# Altium footprint library Power.PcbLib: 11 footprints
Each footprint in its own frame and in the unit in brackets; x right, y up, seen from the top. Pads: shape width x height; smd on the part's side, far side on the other; paste and mask are expansions set on the pad; w line width, h text height; cw(c..) or ccw(c..) is an arc to the next point about the centre after c.
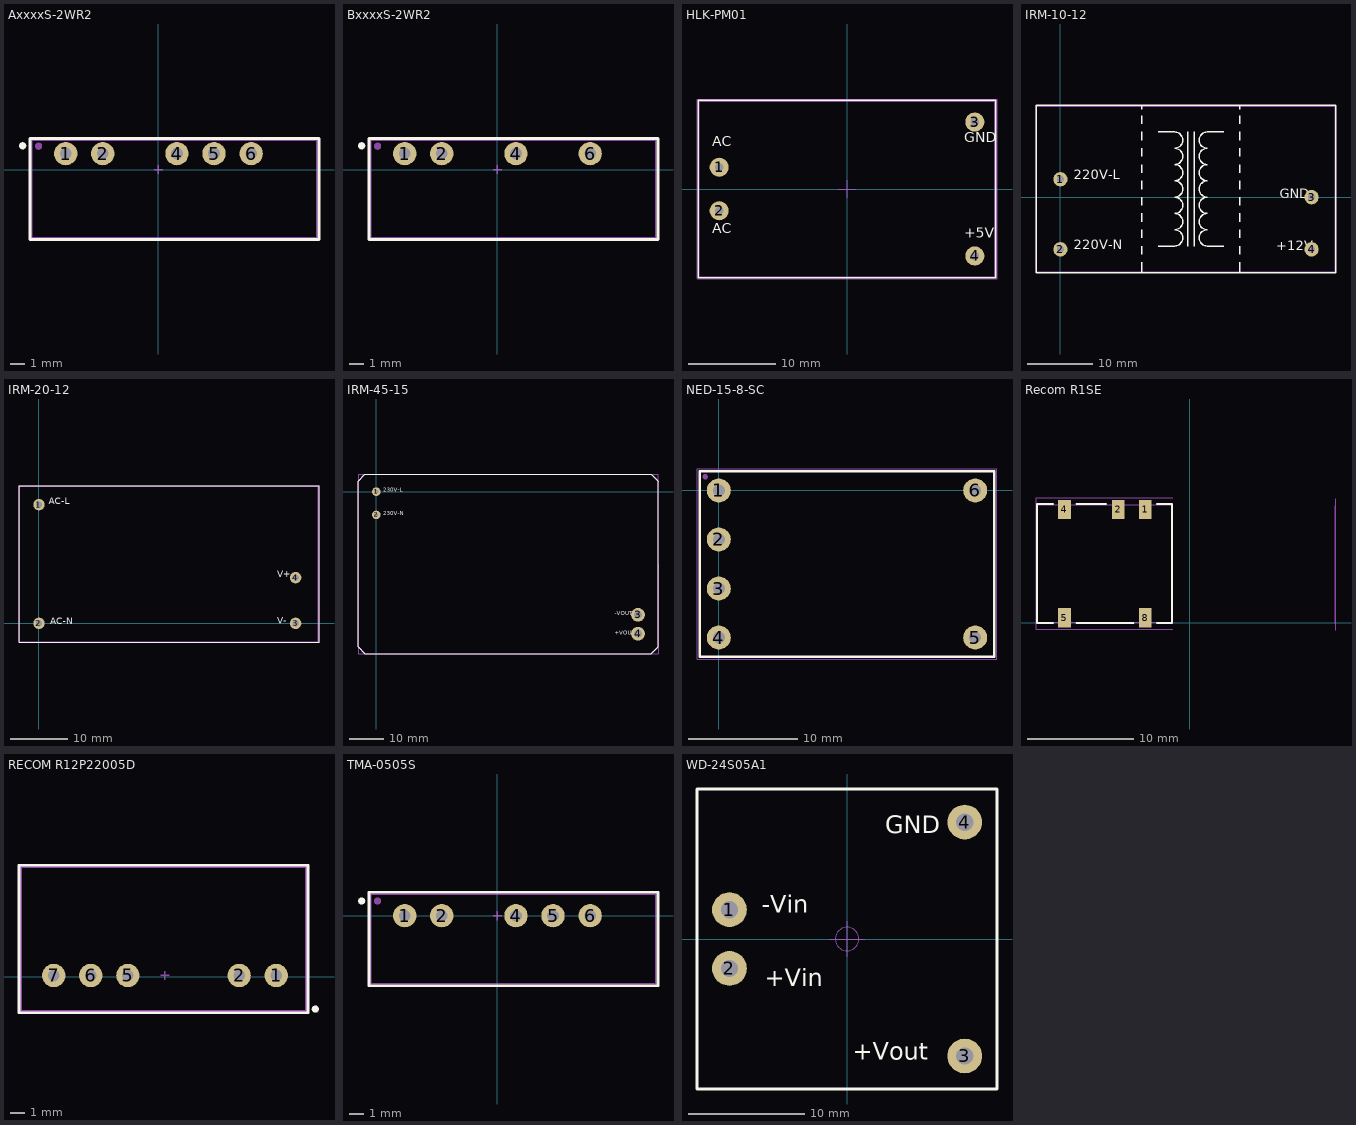
[diagram p0: the footprints below, top view; thin cyan lines are the x and y axes]

## AxxxxS-2WR2 [mm]
pads (7):
  round 1.6 hole 0.8: 1(-6.35,1.092) 2(-3.81,1.092) 4(1.27,1.092) 5(3.81,1.092) 6(6.35,1.092)
  round 0.5 on Top Overlay: ""(-9.296,1.626)
  round 0.5 on Mech1: ""(-8.204,1.6)
Top Overlay:
  lines w0.2: -8.8,-4.8 11,-4.8 11,2.134 -8.8,2.134 -8.8,-4.8
Mechanical 1:
  lines w0.1: -8.66,-4.67 -8.66,2.007 10.84,2.007 10.84,-4.67 -8.66,-4.67
Mechanical 15:
  lines w0.1: -0.3,0 0.3,0 ; 0,-0.3 0,0.3 ; -8.8,-4.8 11,-4.8 11,2.134 -8.8,2.134 -8.8,-4.8
3D body "AxxxxS-2WR2 (1).STEP": height 10.23, standoff -3.53, extent -8.562,-4.89 11.088,2.21

## BxxxxS-2WR2 [mm]
pads (6):
  round 1.6 hole 0.8: 1(-6.35,1.092) 2(-3.81,1.092) 4(1.27,1.092) 6(6.35,1.092)
  round 0.5 on Top Overlay: ""(-9.296,1.626)
  round 0.5 on Mech1: ""(-8.204,1.6)
Top Overlay:
  lines w0.2: -8.8,-4.8 -8.8,2.134 11,2.134 11,-4.8 -8.8,-4.8
Mechanical 1:
  lines w0.1: -8.66,-4.67 10.84,-4.67 10.84,2.007 -8.66,2.007 -8.66,-4.67
Mechanical 15:
  lines w0.1: -0.3,0 0.3,0 ; 0,-0.3 0,0.3 ; -8.8,-4.8 -8.8,2.134 11,2.134 11,-4.8 -8.8,-4.8
3D body "BxxxxS-2WR2 (1).STEP": height 10.23, standoff -3.53, extent -8.585,-5.043 11.065,2.057

## HLK-PM01 [mm]
height 15
pads (4):
  round 2.2 hole 1: 1(-14.7,2.5) 2(-14.7,-2.5) 3(14.7,7.7) 4(14.7,-7.7)
Top Overlay:
  lines w0.2: -17.1,-10.2 -17.1,10.2 17.1,10.2 17.1,-10.2 -0.2,-10.2 -17.1,-10.2
  text "GND" at 13.5,5 h2
  text "+5V" at 13.5,-6 h2
  text "AC" at -15.5,-5.5 h2
  text "AC" at -15.5,4.5 h2
Mechanical 1:
  lines w0.1: -17,-10.1 -17,10.1 17,10.1 17,-10.1 -17,-10.1
Mechanical 15:
  lines w0.1: -1,0 1,0 ; 0,-1 0,1 ; -17.25,-10.35 17.25,-10.35 17.25,10.35 -17.25,10.35 -17.25,-10.35
3D body "HLK-PM01.STEP": height 15.07, standoff -4.95, extent -17,-10.1 17,10.1

## IRM-10-12 [mm]
pads (4):
  round 2.2 hole 1.1: 1(0,2.75) 2(0,-8) 3(38.5,0) 4(38.5,-8)
Top Overlay:
  lines w0.2: 12.5,-11.5 12.5,-10 ; 12.5,-8.75 12.5,-7.5 ; 12.5,-6.25 12.5,-5 ; 12.5,-3.75 12.5,-2.5 ; 12.5,-1.25 12.5,0 ; 12.5,1.25 12.5,2.5 ; 12.5,3.75 12.5,5 ; 12.5,6.25 12.5,7.5 ; 12.5,8.75 12.5,10 ; 12.5,11.25 12.5,12.5 ; 12.5,13.5 12.5,14 ; 15,-7.5 17.5,-7.5 ccw(c17.5,-6.25) 17.5,-5 ccw(c17.5,-3.75) 17.5,-2.5 ccw(c17.5,-1.25) 17.5,0 ccw(c17.5,1.25) 17.5,2.5 ccw(c17.5,3.75) 17.5,5 ccw(c17.5,6.25) 17.5,7.5 ccw(c17.5,8.75) 17.5,10 15,10 ; 19.5,-7.5 19.5,10 ; 20.5,-7.5 20.5,10 ; 25,-7.5 22.5,-7.5 cw(c22.5,-6.25) 22.5,-5 cw(c22.5,-3.75) 22.5,-2.5 cw(c22.5,-1.25) 22.5,0 cw(c22.5,1.25) 22.5,2.5 cw(c22.5,3.75) 22.5,5 cw(c22.5,6.25) 22.5,7.5 cw(c22.5,8.75) 22.5,10 25,10 ; 27.5,-11.5 27.5,-10 ; 27.5,-8.75 27.5,-7.5 ; 27.5,-6.25 27.5,-5 ; 27.5,-3.75 27.5,-2.5 ; 27.5,-1.25 27.5,0 ; 27.5,1.25 27.5,2.5 ; 27.5,3.75 27.5,5 ; 27.5,6.25 27.5,7.5 ; 27.5,8.75 27.5,10 ; 27.5,11.25 27.5,12.5 ; 27.5,13.5 27.5,14 ; -3.75,-11.6 -3.75,14.1 42.25,14.1 42.25,-11.6 -3.75,-11.6
  text "GND" at 33.6,-0.7 h2.5
  text "+12V" at 33.1,-8.7 h2.5
  text "220V-L" at 2,2.2 h2.5
  text "220V-N" at 2,-8.5 h2.5
Mechanical 1:
  lines w0.1: -3.6,-11.45 42.099,-11.45 42.099,13.95 -3.6,13.95 -3.6,-11.45
Mechanical 15:
  lines w0.1: -3.7,-11.55 -3.7,14.05 42.2,14.05 42.2,-11.55 -3.7,-11.55
3D body "User Library-IRM-10-12.STEP": height 22.05, standoff -3.5, extent -3.6,-11.45 42.099,13.95

## IRM-20-12 [mm]
pads (4):
  round 2 hole 1.1: 1(0,20.8) 2(0,0) 3(45,0) 4(45,8)
Top Overlay:
  lines w0.2: -3.5,-3.3 49.1,-3.3 49.1,24.1 -3.5,24.1 -3.5,-3.3
  text "V+" at 41.8,7.6 h2
  text "V-" at 41.8,-0.5 h2
  text "AC-N" at 2,-0.6 h2
  text "AC-L" at 1.7,20.4 h2
Mechanical 1:
  lines w0.1: -3.4,-3.2 49,-3.2 49,24 -3.4,24 -3.4,-3.2
  text "V+" at 41.8,7.6 h2
  text "V-" at 41.8,-0.5 h2
  text "AC-N" at 2,-0.6 h2
  text "AC-L" at 1.7,20.4 h2
Mechanical 15:
  lines w0.1: -3.5,-3.3 -3.5,24.1 49.1,24.1 49.1,-3.3 -3.5,-3.3
3D body "IRM-20-12.STEP": height 24, standoff -3, extent -3.4,-3.2 49,24

## IRM-45-15 [mm]
pads (4):
  round 2.5 hole 1.2: 1(0,0) 2(0,-6.75)
  round 4 hole 2.2: 3(76,-35.75) 4(76,-41.25)
Top Overlay:
  lines w0.2: -5.3,3 -5.3,-45.05 -3.3,-47.05 79.8,-47.05 81.8,-45.05 81.8,3 79.8,5 -3.3,5 -5.3,3 ; -5.3,3 -5.3,3
  text "-VOUT" at 69.25,-36.25 h2
  text "+VOUT" at 69.25,-42 h2
  text "230V-L" at 2,-0.5 h2
  text "230V-N" at 2,-7.25 h2
Mechanical 1:
  lines w0.1: -5.3,-45.05 -3.25,-47.1 79.75,-47.1 81.8,-45.05 81.8,3 79.8,5 -3.3,5 -5.3,3 -5.3,-45.05
  text "-VOUT" at 69.25,-36.25 h2
  text "+VOUT" at 69.25,-42 h2
  text "230V-N" at 2,-7.25 h2
  text "230V-L" at 2,-0.5 h2
Mechanical 15:
  lines w0.1: -5.3,-47.1 -5.3,5.1 81.8,5.1 81.8,-47.1 -5.3,-47.1
3D body "IRM-45-15.step": height 29.51, standoff -3.5, extent -5.25,-47 81.75,5

## NED-15-8-SC [mm]
pads (7):
  round 2.2 hole 1.1: 1(0,0) 2(0,-4.5) 3(0,-9) 4(0,-13.5) 5(23.5,-13.5) 6(23.5,0)
  round 0.5 on Mech1: ""(-1.25,1.25)
Top Overlay:
  lines w0.2: -1.75,-15.25 -1.75,1.75 25.25,1.75 25.25,-15.25 -1.75,-15.25
Mechanical 1:
  lines w0.1: -1.75,-15.25 25.25,-15.25 25.25,1.75 -1.75,1.75 -1.75,-15.25
Mechanical 15:
  lines w0.1: -2,-15.5 -2,2 25.5,2 25.5,-15.5 -2,-15.5
3D body "PCB for isolatorPcbDoc.step": height 8.2, standoff -3.57, extent -1.75,-15.25 25.25,1.75

## Recom R1SE [mm]
pads (5):
  rect 1.2x1.8 smd: 1(-4.166,10.668) 2(-6.706,10.668) 4(-11.786,10.668) 5(-11.786,0.468) 8(-4.166,0.468)
Top Overlay:
  lines w0.2: -12.866,-0.032 -14.366,-0.032 -14.366,11.168 -12.866,11.168 ; -10.666,-0.032 -5.266,-0.032 ; -10.666,11.168 -7.866,11.168 ; -3.066,-0.032 -1.666,-0.032 -1.666,11.168 -3.066,11.168
Mechanical 1:
  lines w0.1: -1.641,0.018 -14.391,0.018 -14.391,11.118 -1.641,11.118 ; 13.726,-0.058 13.726,11.042
Mechanical 15:
  lines w0.1: -1.566,-0.632 -14.466,-0.632 -14.466,11.768 -1.566,11.768 ; 13.801,-0.708 13.801,11.692
3D body "User Library-RECOM_R1S-xxxx.STEP": height 7, standoff 0, extent -14.391,0.018 -1.641,11.118

## RECOM R12P22005D [mm]
pads (6):
  round 1.6 hole 0.8: 1(-4.547,0.076) 2(-7.087,0.076) 5(-14.707,0.076) 6(-17.247,0.076) 7(-19.787,0.076)
  round 0.5 on Top Overlay: ""(-1.867,-2.224)
Top Overlay:
  lines w0.2: -22.167,-2.474 -22.167,7.626 -2.367,7.626 -2.367,-2.474 -22.167,-2.474
Mechanical 1:
  lines w0.1: -22.017,-2.324 -22.017,7.476 -2.517,7.476 -2.517,-2.324 -22.017,-2.324
Mechanical 15:
  lines w0.1: -12.467,0.076 -11.867,0.076 ; -12.167,-0.224 -12.167,0.376 ; -22.117,-2.424 -22.117,7.576 -2.417,7.576 -2.417,-2.424 -22.117,-2.424
3D body "SIP-7 (19.5x9.8x12.5).STEP": height 12.51, standoff -4.09, extent -22.017,-2.324 -2.517,7.476

## TMA-0505S [mm]
pads (7):
  round 1.6 hole 0.8: 1(-6.35,0) 2(-3.81,0) 4(1.27,0) 5(3.81,0) 6(6.35,0)
  round 0.5 on Top Overlay: ""(-9.3,1)
  round 0.5 on Mech1: ""(-8.21,1)
Top Overlay:
  lines w0.2: -8.8,-4.8 -8.8,1.6 11,1.6 11,-4.8 -8.8,-4.8
Mechanical 1:
  lines w0.1: -8.66,-4.67 10.84,-4.67 10.84,1.45 -8.66,1.45 -8.66,-4.67
Mechanical 15:
  lines w0.1: -0.3,0 0.3,0 ; 0,-0.3 0,0.3 ; -8.8,-4.8 -8.8,1.6 11,1.6 11,-4.8 -8.8,-4.8
3D body "User Library-Traco TMA 0505S.STEP": height 10.2, standoff -3.2, extent -8.66,-4.67 10.84,1.45

## WD-24S05A1 [mm] "3W-24Vת5Vģ��"
pads (4):
  round 3 hole 1.5: 1(-10.15,2.538) 2(-10.15,-2.542) 3(10.17,-10.102) 4(10.17,10.098)
Top Overlay:
  lines w0.254: -12.954,-12.954 12.954,-12.954 12.954,12.954 -12.954,12.954 -12.954,-12.954
  text "+Vout" at 0.508,-10.414 h1.52
  text "GND" at 3.302,9.144 h1.52
  text "-Vin" at -7.366,2.286 h1.52
  text "+Vin" at -7.112,-4.064 h1.52
Mechanical 15:
  circle w0.1: c0,0 r1.016
  lines w0.1: -1.524,0 1.524,0 ; 0,-1.524 0,1.524
3D body "WD3-24S05A1.STEP": height 8.6, standoff -3.1, extent -12.75,-12.75 12.75,12.75